# Altium footprint library MyPcbLib.PcbLib: 657 footprints (part 23 of 42)
Each footprint in its own frame and in the unit in brackets; x right, y up, seen from the top. Pads: shape width x height; smd on the part's side, far side on the other; paste and mask are expansions set on the pad; w line width, h text height; cw(c..) or ccw(c..) is an arc to the next point about the centre after c.
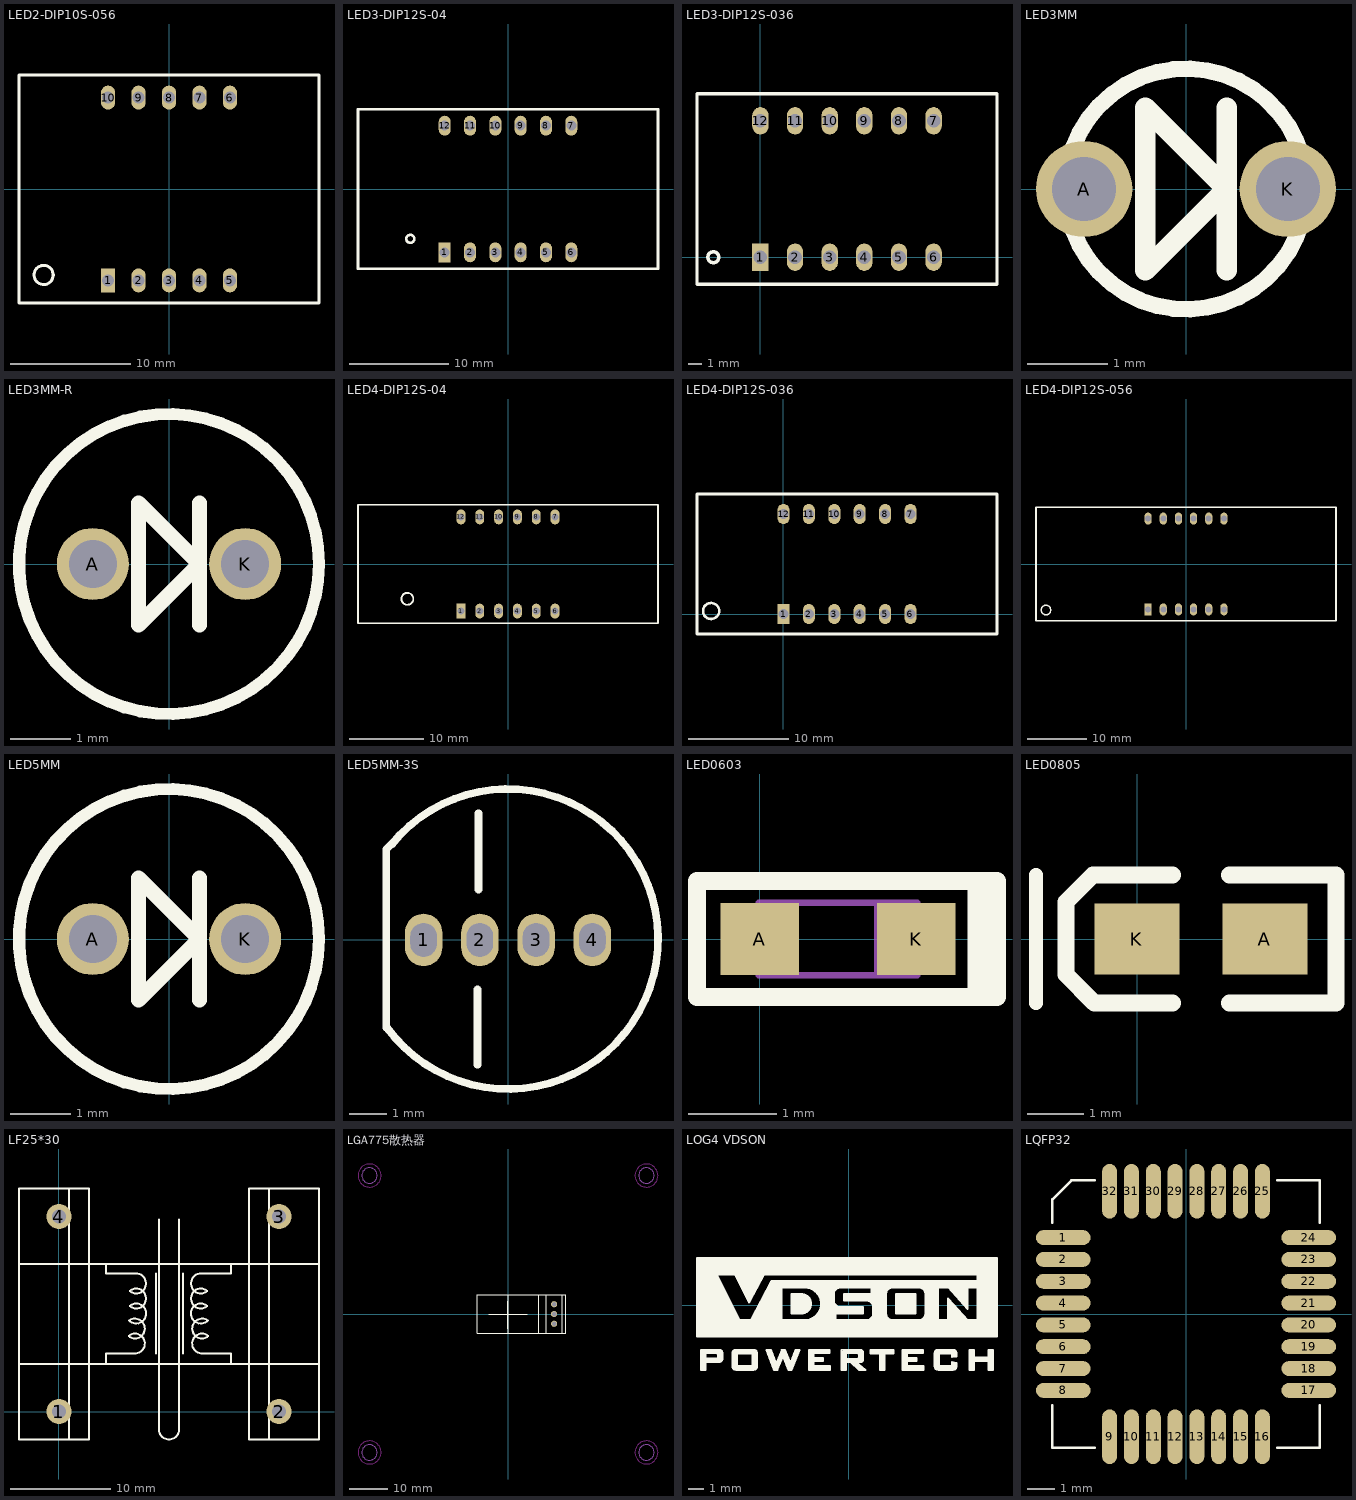
[diagram p22: the footprints below, top view; thin cyan lines are the x and y axes]

## LED2-DIP10S-056 [mm]
pads (10):
  rect 1.2x2 hole 1: 1(-5.08,-7.62)
  oval 1.2x2 hole 1: 2(-2.54,-7.62) 3(0,-7.62) 4(2.54,-7.62) 5(5.08,-7.62) 6(5.08,7.62) 7(2.54,7.62) 8(0,7.62) 9(-2.54,7.62) 10(-5.08,7.62)
Top Overlay:
  circle w0.254: c-10.449,-7.163 r0.803
  lines w0.254: -12.5,-9.5 -12.5,9.5 12.5,9.5 12.5,-9.5 -12.5,-9.5

## LED3-DIP12S-04 [mm]
pads (12):
  rect 1.2x2 hole 1: 1(-6.35,-6.35)
  oval 1.2x2 hole 1: 2(-3.81,-6.35) 3(-1.27,-6.35) 4(1.27,-6.35) 5(3.81,-6.35) 6(6.35,-6.35) 7(6.35,6.35) 8(3.81,6.35) 9(1.27,6.35) 10(-1.27,6.35) 11(-3.81,6.35) 12(-6.35,6.35)
Top Overlay:
  circle w0.254: c-9.804,-5.004 r0.4
  lines w0.254: -15.05,-8 15.05,-8 15.05,8 -15.05,8 -15.05,-8

## LED3-DIP12S-036 [mm]
pads (12):
  rect 1.2x2 hole 1: 1(0,0)
  oval 1.2x2 hole 1: 2(2.54,0) 3(5.08,0) 4(7.62,0) 5(10.16,0) 6(12.7,0) 7(12.7,10) 8(10.16,10) 9(7.62,10) 10(5.08,10) 11(2.54,10) 12(0,10)
Top Overlay:
  circle w0.254: c-3.454,-0.004 r0.4
  lines w0.254: -4.65,-2 17.35,-2 17.35,12 -4.65,12 -4.65,-2

## LED3MM [mm]
pads (2):
  round 1.2 hole 0.8: A(-1.27,0) K(1.27,0)
Top Overlay:
  circle w0.203: c0,0 r1.5
  lines w0.254: 0.508,-1.016 0.508,1.016 ; -0.508,-1.016 -0.508,1.016 0.508,0 -0.508,-1.016
3D body: height 7.6, standoff -1, extent -1.949,-1.965 1.651,2.017

## LED3MM-R [mm]
pads (2):
  round 1.2 hole 0.8: A(-1.27,0) K(1.27,0)
Top Overlay:
  circle w0.203: c0,0 r2.5
  lines w0.254: 0.508,-1.016 0.508,1.016 ; -0.508,-1.016 -0.508,1.016 0.508,0 -0.508,-1.016
3D body: height 5.6, standoff -3, extent -1.949,-1.965 1.651,2.017

## LED4-DIP12S-04 [mm]
pads (12):
  rect 1.2x2 hole 1: 1(-6.35,-6.35)
  oval 1.2x2 hole 1: 2(-3.81,-6.35) 3(-1.27,-6.35) 4(1.27,-6.35) 5(3.81,-6.35) 6(6.35,-6.35) 7(6.35,6.35) 8(3.81,6.35) 9(1.27,6.35) 10(-1.27,6.35) 11(-3.81,6.35) 12(-6.35,6.35)
Top Overlay:
  circle w0.254: c-13.589,-4.699 r0.803
  lines w0.254: -20.25,-8 -20.25,8 20.25,8 20.25,-8 -20.25,-8

## LED4-DIP12S-036 [mm]
pads (12):
  rect 1.2x2 hole 1: 1(0.003,0)
  oval 1.2x2 hole 1: 2(2.543,0) 3(5.083,0) 4(7.623,0) 5(10.163,0) 6(12.703,0) 7(12.703,10) 8(10.163,10) 9(7.623,10) 10(5.083,10) 11(2.543,10) 12(0.003,10)
Top Overlay:
  circle w0.254: c-7.236,0.301 r0.803
  lines w0.254: -8.647,-2 -8.647,12 21.353,12 21.353,-2 -8.647,-2
3D body: height 7.2, standoff -2.8, extent -8.599,-2.022 21.401,11.978

## LED4-DIP12S-056 [mm]
pads (12):
  rect 1.2x2 hole 1: 1(-6.35,-7.62)
  oval 1.2x2 hole 1: 2(-3.81,-7.62) 3(-1.27,-7.62) 4(1.27,-7.62) 5(3.81,-7.62) 6(6.35,-7.62) 7(6.35,7.62) 8(3.81,7.62) 9(1.27,7.62) 10(-1.27,7.62) 11(-3.81,7.62) 12(-6.35,7.62)
Top Overlay:
  circle w0.254: c-23.479,-7.722 r0.803
  lines w0.254: -25.15,-9.5 -25.15,9.5 ; -25,-9.5 25,-9.5 ; -25,9.5 25,9.5 ; 25.15,-9.5 25.15,9.5
3D body: height 1.53, standoff -8.27, extent -25.201,-9.474 25.099,9.526

## LED5MM [mm]
pads (2):
  round 1.2 hole 0.8: A(-1.27,0) K(1.27,0)
Top Overlay:
  circle w0.203: c0,0 r2.5
  lines w0.254: 0.508,-1.016 0.508,1.016 ; -0.508,-1.016 0.508,0 -0.508,1.016 -0.508,-1.016
3D body: height 8, standoff -3, extent -2.864,-2.808 2.6,2.91

## LED5MM-3S [mm] "三色LED"
pads (4):
  oval 1x1.4 hole 0.7 slot 0.9 at 90 deg: 1(-2.25,0) 2(-0.75,0) 3(0.75,0) 4(2.25,0)
Top Overlay:
  lines w0.203: -3.251,-2.337 -3.251,2.413 -3.048,2.616 ; -3.233,-2.33 ccw(c0,0.025) -3.11,2.541 ; -0.813,-3.327 -0.813,-1.321 ; -0.787,1.346 -0.787,3.378

## LED0603 [mil]
pads (2):
  rect 35x32 smd: A(0,0) K(70,0)
Top Overlay:
  lines w8: 97,-25 97,25 ; 102,-26 102,26 ; -28,-26 106.08,-26 106.08,26 -28,26 -28,-26
Mechanical 1:
  lines w3: 52.71,-16.14 52.71,16.14 ; 55.66,-16.14 55.66,16.14 ; 59.6,-16.14 59.6,16.14 ; -0.4,-16.14 70.48,-16.14 70.48,16.14 -0.4,16.14 -0.4,-16.14

## LED0805 [mil]
pads (2):
  rect 60x50 smd: A(89.8,0) K(-0.2,0)
Top Overlay:
  lines w10: -71.2,-45 -71.2,45
  lines w12: -50.2,25 -50.2,-25 -30.2,-45 24.8,-45 ; -50.2,26 -31.2,45 24.8,45 ; 64.8,-45 139.8,-45 139.8,45 64.8,45

## LF25*30 [mm]
pads (4):
  round 2.5 hole 1.4: 1(0,0) 2(22,0) 3(22,19.5) 4(0,19.5)
Top Overlay:
  lines w0.2: -4,4.75 26,4.75 ; -4,14.75 26,14.75 ; 1,-2.8 1,22.3 ; 4.7,4.75 4.703,5.803 7.7,5.803 ccw(c7.58,6.795) 7.58,7.795 ccw(c7.58,6.942) 6.976,7.545 ccw(c7.58,8.149) 7.58,7.295 ccw(c7.58,8.295) 6.998,9.109 ccw(c7.721,9.8) 7.721,10.8 ; 4.7,14.75 4.7,13.8 7.7,13.8 cw(c7.7,12.8) 7.7,11.8 cw(c7.7,12.654) 7.096,12.05 cw(c7.7,11.446) 7.7,12.3 cw(c7.7,11.3) 7.7,10.3 cw(c7.7,11.154) 7.096,10.55 cw(c7.7,9.946) 7.7,10.8 ; 9.7,5.8 9.7,13.8 ; 10,19.2 10,-1.8 ccw(c11,-1.8) 12,-1.8 12,19.2 ; 12.4,5.8 12.4,13.8 ; 14.179,10.8 ccw(c14.179,9.8) 14.901,9.109 ccw(c14.32,8.295) 14.32,7.295 ccw(c14.32,8.149) 14.924,7.545 ccw(c14.32,6.942) 14.32,7.795 ccw(c14.32,6.795) 14.2,5.803 17.197,5.803 17.2,4.75 ; 14.2,10.8 cw(c14.2,9.946) 14.804,10.55 cw(c14.2,11.154) 14.2,10.3 cw(c14.2,11.3) 14.2,12.3 cw(c14.2,11.446) 14.804,12.05 cw(c14.2,12.654) 14.2,11.8 cw(c14.2,12.8) 14.2,13.8 17.2,13.8 17.2,14.75 ; 21,-2.8 21,22.3 ; 21,22.3 26,22.3 26,-2.8 19,-2.8 19,22.3 21,22.3 ; -4,-2.8 3,-2.8 3,22.3 -4,22.3 -4,-2.8

## LGA775散热器 [mm]
pads (3):
  round 1.6 hole 1.2: 1(11.989,2.54) 2(11.989,0) 3(11.989,-2.54)
Top Overlay:
  lines w0.203: -5,0 5,0 ; -4.318,0 4.648,0 ; -0.011,-3.785 -0.011,3.327 ; 0,-5 0,5 ; 7.989,-4.978 7.989,4.953 ; 9.957,4.978 -8.011,4.978 -8.011,-5.029 9.982,-5.029 ; 14.097,-4.924 14.097,5 ; 9.989,-5 14.989,-5 14.989,5 9.989,5 9.989,-5
Bottom Overlay:
  circle w0.203: c0,0 r20
Keep-Out Layer:
  circle w0.203: c-36,-36 r3
  circle w0.203: c36,-36 r3
  circle w0.203: c36,36 r3
  circle w0.203: c-36,36 r3
Mechanical 1:
  circle w0.203: c36,-36 r2
  circle w0.203: c36,36 r2
  circle w0.203: c-36,36 r2
  circle w0.203: c-36,-36 r2
3D body: height 1, standoff -16.2, extent 9.881,-5.025 14.281,4.975

## LOG4 VDSON [mm]
Top Overlay:
  drawing of 1770 lines, arcs and shapes, not listed

## LQFP32 [mm]
pads (32):
  oval 2x0.55 smd: 1(-4.5,2.8) 2(-4.5,2) 3(-4.5,1.2) 4(-4.5,0.4) 5(-4.5,-0.4) 6(-4.5,-1.2) 7(-4.5,-2) 8(-4.5,-2.8) 17(4.5,-2.8) 18(4.5,-2) 19(4.5,-1.2) 20(4.5,-0.4) 21(4.5,0.4) 22(4.5,1.2) 23(4.5,2) 24(4.5,2.8)
  oval 0.55x2 smd: 9(-2.8,-4.5) 10(-2,-4.5) 11(-1.2,-4.5) 12(-0.4,-4.5) 13(0.4,-4.5) 14(1.2,-4.5) 15(2,-4.5) 16(2.8,-4.5) 25(2.8,4.5) 26(2,4.5) 27(1.2,4.5) 28(0.4,4.5) 29(-0.4,4.5) 30(-1.2,4.5) 31(-2,4.5) 32(-2.8,4.5)
Top Overlay:
  lines w0.1: -4.9,-3.35 -4.9,-4.9 -3.35,-4.9 ; -4.9,3.35 -4.9,4.2 -4.2,4.9 -3.35,4.9 ; 3.35,-4.9 4.9,-4.9 4.9,-3.35 ; 3.35,4.9 4.9,4.9 4.9,3.35